# Altium integrated library Weidmueller_OMNIMATE_Signal.IntLib: 2550 symbols (part 11 of 45)
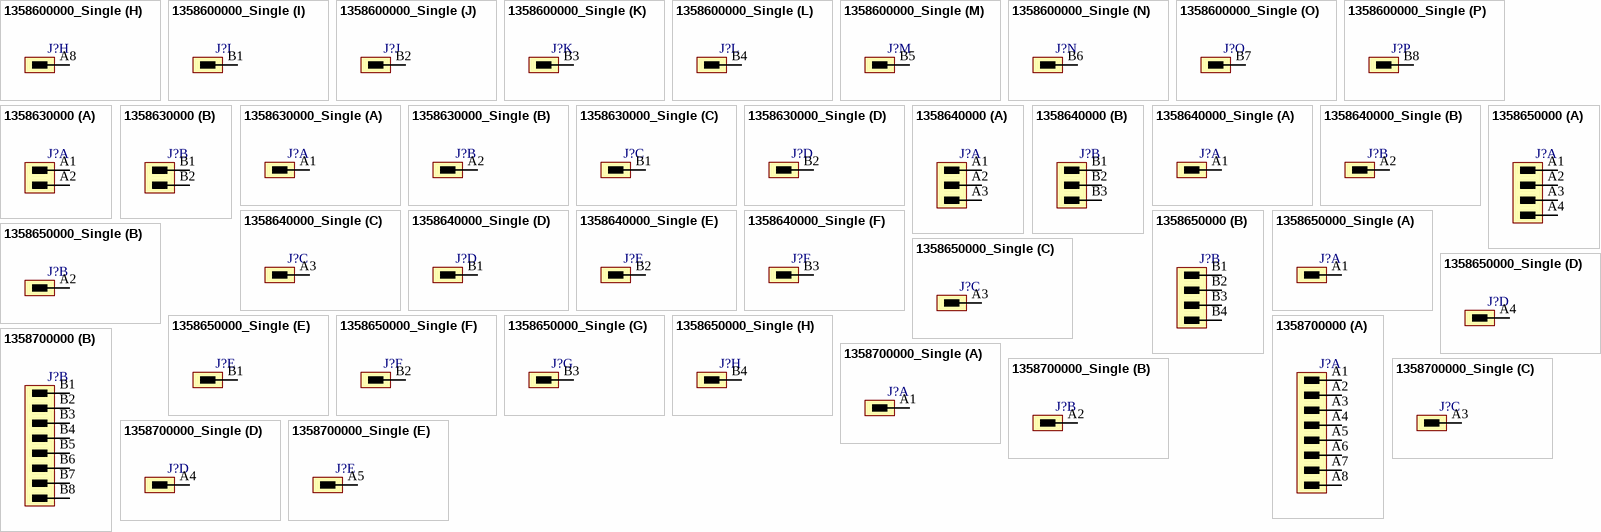
[diagram p221: symbols 1358600000_Single to 1358700000_Single]

## 1358630000_Single
designator J?
OMNIMATE Signal - series B2C/S2C 3.50 - 2-row; PartNumber: 1358630000; Manufacturer: Weidmueller; Short_text_for_material: S2C-SMT 3.50/04/180LF 1.5SN BK RL; Side_termination_characteristic: Solder flange; Mounting_onto_the_PCB: Reflow solder connection; Pitch_mm: 3.5 mm; Pitch_inch: 0.138 inch; No_of_poles: 4; Outgoing_elbow: 180°; Solder_pin_length_mm: 1.5 mm; Insulating_material: LCP GF; UL_94_flammability_rating: V-0; Rated_voltage_for_surge_voltage_class_pollution_degree_II_2: 200 V; Rated_current_min_no_of_poles_TU_20_deg_C: 13.4 A; Rated_voltage_use_group_B_UL_1059: 150 V; Rated_current_use_group_B_UL_1059: 10 A; PackageReference: S2C_SMT_3_50_180LF_04; Colour: Black; Packaging: Tape; Qty: 175 PCS; Revision: V1; ComponentLink1Description: Manufacturer URL; ComponentLink1URL: http://www.weidmueller.com/; ComponentLink2Description: URL Link1; ComponentLink2URL: http://catalog.weidmueller.com/catalog/Start.do?localeId=en&ObjectID=1358630000
footprint S2C_SMT_3_50_180LF_04 (OMNIMATE Signal - Serie B2C/S2C 3.50 - 2-reihig  S2C-SMT 3.50/04/180LF 3.5)
part A pins: A1
part B pins: A2
part C pins: B1
part D pins: B2

## 1358640000
designator J?
OMNIMATE Signal - series B2C/S2C 3.50 - 2-row; PartNumber: 1358640000; Manufacturer: Weidmueller; Short_text_for_material: S2C-SMT 3.50/06/180LF 1.5SN BK RL; Side_termination_characteristic: Solder flange; Mounting_onto_the_PCB: Reflow solder connection; Pitch_mm: 3.5 mm; Pitch_inch: 0.138 inch; No_of_poles: 6; Outgoing_elbow: 180°; Solder_pin_length_mm: 1.5 mm; Insulating_material: LCP GF; UL_94_flammability_rating: V-0; Rated_voltage_for_surge_voltage_class_pollution_degree_II_2: 200 V; Rated_current_min_no_of_poles_TU_20_deg_C: 13.4 A; Rated_voltage_use_group_B_UL_1059: 150 V; Rated_current_use_group_B_UL_1059: 10 A; PackageReference: S2C_SMT_3_50_180LF_06; Colour: Black; Packaging: Tape; Qty: 175 PCS; Revision: V1; ComponentLink1Description: Manufacturer URL; ComponentLink1URL: http://www.weidmueller.com/; ComponentLink2Description: URL Link1; ComponentLink2URL: http://catalog.weidmueller.com/catalog/Start.do?localeId=en&ObjectID=1358640000
footprint S2C_SMT_3_50_180LF_06 (OMNIMATE Signal - Serie B2C/S2C 3.50 - 2-reihig  S2C-SMT 3.50/06/180LF 3.5)
part A pins: A1, A2, A3
part B pins: B1, B2, B3

## 1358640000_Single
designator J?
OMNIMATE Signal - series B2C/S2C 3.50 - 2-row; PartNumber: 1358640000; Manufacturer: Weidmueller; Short_text_for_material: S2C-SMT 3.50/06/180LF 1.5SN BK RL; Side_termination_characteristic: Solder flange; Mounting_onto_the_PCB: Reflow solder connection; Pitch_mm: 3.5 mm; Pitch_inch: 0.138 inch; No_of_poles: 6; Outgoing_elbow: 180°; Solder_pin_length_mm: 1.5 mm; Insulating_material: LCP GF; UL_94_flammability_rating: V-0; Rated_voltage_for_surge_voltage_class_pollution_degree_II_2: 200 V; Rated_current_min_no_of_poles_TU_20_deg_C: 13.4 A; Rated_voltage_use_group_B_UL_1059: 150 V; Rated_current_use_group_B_UL_1059: 10 A; PackageReference: S2C_SMT_3_50_180LF_06; Colour: Black; Packaging: Tape; Qty: 175 PCS; Revision: V1; ComponentLink1Description: Manufacturer URL; ComponentLink1URL: http://www.weidmueller.com/; ComponentLink2Description: URL Link1; ComponentLink2URL: http://catalog.weidmueller.com/catalog/Start.do?localeId=en&ObjectID=1358640000
footprint S2C_SMT_3_50_180LF_06 (OMNIMATE Signal - Serie B2C/S2C 3.50 - 2-reihig  S2C-SMT 3.50/06/180LF 3.5)
part A pins: A1
part B pins: A2
part C pins: A3
part D pins: B1
part E pins: B2
part F pins: B3

## 1358650000
designator J?
OMNIMATE Signal - series B2C/S2C 3.50 - 2-row; PartNumber: 1358650000; Manufacturer: Weidmueller; Short_text_for_material: S2C-SMT 3.50/08/180LF 1.5SN BK RL; Side_termination_characteristic: Solder flange; Mounting_onto_the_PCB: Reflow solder connection; Pitch_mm: 3.5 mm; Pitch_inch: 0.138 inch; No_of_poles: 8; Outgoing_elbow: 180°; Solder_pin_length_mm: 1.5 mm; Insulating_material: LCP GF; UL_94_flammability_rating: V-0; Rated_voltage_for_surge_voltage_class_pollution_degree_II_2: 200 V; Rated_current_min_no_of_poles_TU_20_deg_C: 13.4 A; Rated_voltage_use_group_B_UL_1059: 150 V; Rated_current_use_group_B_UL_1059: 10 A; PackageReference: S2C_SMT_3_50_180LF_08; Colour: Black; Packaging: Tape; Qty: 175 PCS; Revision: V1; ComponentLink1Description: Manufacturer URL; ComponentLink1URL: http://www.weidmueller.com/; ComponentLink2Description: URL Link1; ComponentLink2URL: http://catalog.weidmueller.com/catalog/Start.do?localeId=en&ObjectID=1358650000
footprint S2C_SMT_3_50_180LF_08 (OMNIMATE Signal - Serie B2C/S2C 3.50 - 2-reihig  S2C-SMT 3.50/08/180LF 3.5)
part A pins: A1, A2, A3, A4
part B pins: B1, B2, B3, B4

## 1358650000_Single
designator J?
OMNIMATE Signal - series B2C/S2C 3.50 - 2-row; PartNumber: 1358650000; Manufacturer: Weidmueller; Short_text_for_material: S2C-SMT 3.50/08/180LF 1.5SN BK RL; Side_termination_characteristic: Solder flange; Mounting_onto_the_PCB: Reflow solder connection; Pitch_mm: 3.5 mm; Pitch_inch: 0.138 inch; No_of_poles: 8; Outgoing_elbow: 180°; Solder_pin_length_mm: 1.5 mm; Insulating_material: LCP GF; UL_94_flammability_rating: V-0; Rated_voltage_for_surge_voltage_class_pollution_degree_II_2: 200 V; Rated_current_min_no_of_poles_TU_20_deg_C: 13.4 A; Rated_voltage_use_group_B_UL_1059: 150 V; Rated_current_use_group_B_UL_1059: 10 A; PackageReference: S2C_SMT_3_50_180LF_08; Colour: Black; Packaging: Tape; Qty: 175 PCS; Revision: V1; ComponentLink1Description: Manufacturer URL; ComponentLink1URL: http://www.weidmueller.com/; ComponentLink2Description: URL Link1; ComponentLink2URL: http://catalog.weidmueller.com/catalog/Start.do?localeId=en&ObjectID=1358650000
footprint S2C_SMT_3_50_180LF_08 (OMNIMATE Signal - Serie B2C/S2C 3.50 - 2-reihig  S2C-SMT 3.50/08/180LF 3.5)
part A pins: A1
part B pins: A2
part C pins: A3
part D pins: A4
part E pins: B1
part F pins: B2
part G pins: B3
part H pins: B4

## 1358700000
designator J?
OMNIMATE Signal - series B2C/S2C 3.50 - 2-row; PartNumber: 1358700000; Manufacturer: Weidmueller; Short_text_for_material: S2C-SMT 3.50/16/180LF 1.5SN BK RL; Side_termination_characteristic: Solder flange; Mounting_onto_the_PCB: Reflow solder connection; Pitch_mm: 3.5 mm; Pitch_inch: 0.138 inch; No_of_poles: 16; Outgoing_elbow: 180°; Solder_pin_length_mm: 1.5 mm; Insulating_material: LCP GF; UL_94_flammability_rating: V-0; Rated_voltage_for_surge_voltage_class_pollution_degree_II_2: 200 V; Rated_current_min_no_of_poles_TU_20_deg_C: 13.4 A; Rated_voltage_use_group_B_UL_1059: 150 V; Rated_current_use_group_B_UL_1059: 10 A; PackageReference: S2C_SMT_3_50_180LF_16; Colour: Black; Packaging: Tape; Qty: 175 PCS; Revision: V1; ComponentLink1Description: Manufacturer URL; ComponentLink1URL: http://www.weidmueller.com/; ComponentLink2Description: URL Link1; ComponentLink2URL: http://catalog.weidmueller.com/catalog/Start.do?localeId=en&ObjectID=1358700000
footprint S2C_SMT_3_50_180LF_16 (OMNIMATE Signal - Serie B2C/S2C 3.50 - 2-reihig  S2C-SMT 3.50/16/180LF 3.5)
part A pins: A1, A2, A3, A4, A5, A6, A7, A8
part B pins: B1, B2, B3, B4, B5, B6, B7, B8

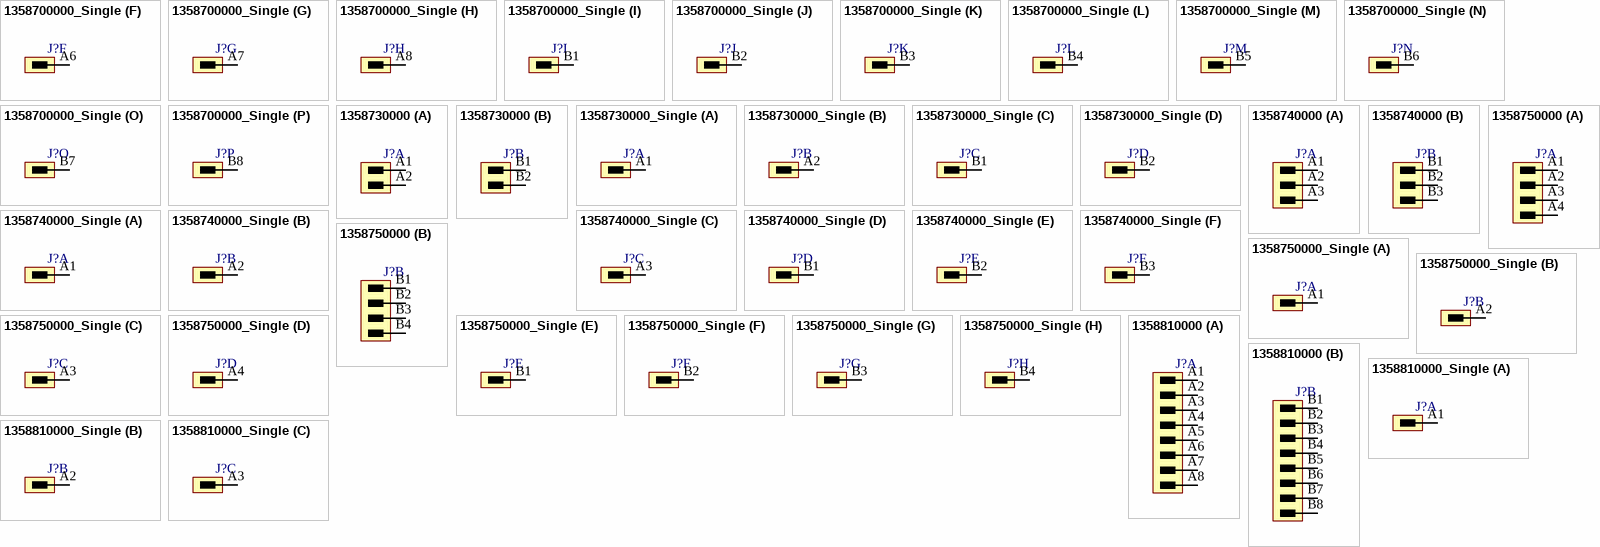
[diagram p60: symbols 1358700000_Single to 1358810000_Single]

## 1358700000_Single
designator J?
OMNIMATE Signal - series B2C/S2C 3.50 - 2-row; PartNumber: 1358700000; Manufacturer: Weidmueller; Short_text_for_material: S2C-SMT 3.50/16/180LF 1.5SN BK RL; Side_termination_characteristic: Solder flange; Mounting_onto_the_PCB: Reflow solder connection; Pitch_mm: 3.5 mm; Pitch_inch: 0.138 inch; No_of_poles: 16; Outgoing_elbow: 180°; Solder_pin_length_mm: 1.5 mm; Insulating_material: LCP GF; UL_94_flammability_rating: V-0; Rated_voltage_for_surge_voltage_class_pollution_degree_II_2: 200 V; Rated_current_min_no_of_poles_TU_20_deg_C: 13.4 A; Rated_voltage_use_group_B_UL_1059: 150 V; Rated_current_use_group_B_UL_1059: 10 A; PackageReference: S2C_SMT_3_50_180LF_16; Colour: Black; Packaging: Tape; Qty: 175 PCS; Revision: V1; ComponentLink1Description: Manufacturer URL; ComponentLink1URL: http://www.weidmueller.com/; ComponentLink2Description: URL Link1; ComponentLink2URL: http://catalog.weidmueller.com/catalog/Start.do?localeId=en&ObjectID=1358700000
footprint S2C_SMT_3_50_180LF_16 (OMNIMATE Signal - Serie B2C/S2C 3.50 - 2-reihig  S2C-SMT 3.50/16/180LF 3.5)
part A pins: A1
part B pins: A2
part C pins: A3
part D pins: A4
part E pins: A5
part F pins: A6
part G pins: A7
part H pins: A8
part I pins: B1
part J pins: B2
part K pins: B3
part L pins: B4
part M pins: B5
part N pins: B6
part O pins: B7
part P pins: B8

## 1358730000
designator J?
OMNIMATE Signal - series B2C/S2C 3.50 - 2-row; PartNumber: 1358730000; Manufacturer: Weidmueller; Short_text_for_material: S2C-SMT 3.50/04/180G 3.5SN BK RL; Side_termination_characteristic: closed side; Mounting_onto_the_PCB: Reflow solder connection; Pitch_mm: 3.5 mm; Pitch_inch: 0.138 inch; No_of_poles: 4; Outgoing_elbow: 180°; Insulating_material: LCP GF; UL_94_flammability_rating: V-0; Rated_voltage_for_surge_voltage_class_pollution_degree_II_2: 200 V; Rated_current_min_no_of_poles_TU_20_deg_C: 13.4 A; Rated_voltage_use_group_B_UL_1059: 150 V; Rated_current_use_group_B_UL_1059: 10 A; PackageReference: S2C_SMT_3_50_180G_04; Colour: Black; Solder_pin_length_mm: 3.5 mm; Packaging: Tape; Qty: 175 PCS; Revision: V1; ComponentLink1Description: Manufacturer URL; ComponentLink1URL: http://www.weidmueller.com/; ComponentLink2Description: URL Link1; ComponentLink2URL: http://catalog.weidmueller.com/catalog/Start.do?localeId=en&ObjectID=1358730000
footprint S2C_SMT_3_50_180G_04 (OMNIMATE Signal - Serie B2C/S2C 3.50 - 2-reihig  S2C-SMT 3.50/04/180G 1.5)
part A pins: A1, A2
part B pins: B1, B2

## 1358730000_Single
designator J?
OMNIMATE Signal - series B2C/S2C 3.50 - 2-row; PartNumber: 1358730000; Manufacturer: Weidmueller; Short_text_for_material: S2C-SMT 3.50/04/180G 3.5SN BK RL; Side_termination_characteristic: closed side; Mounting_onto_the_PCB: Reflow solder connection; Pitch_mm: 3.5 mm; Pitch_inch: 0.138 inch; No_of_poles: 4; Outgoing_elbow: 180°; Insulating_material: LCP GF; UL_94_flammability_rating: V-0; Rated_voltage_for_surge_voltage_class_pollution_degree_II_2: 200 V; Rated_current_min_no_of_poles_TU_20_deg_C: 13.4 A; Rated_voltage_use_group_B_UL_1059: 150 V; Rated_current_use_group_B_UL_1059: 10 A; PackageReference: S2C_SMT_3_50_180G_04; Colour: Black; Solder_pin_length_mm: 3.5 mm; Packaging: Tape; Qty: 175 PCS; Revision: V1; ComponentLink1Description: Manufacturer URL; ComponentLink1URL: http://www.weidmueller.com/; ComponentLink2Description: URL Link1; ComponentLink2URL: http://catalog.weidmueller.com/catalog/Start.do?localeId=en&ObjectID=1358730000
footprint S2C_SMT_3_50_180G_04 (OMNIMATE Signal - Serie B2C/S2C 3.50 - 2-reihig  S2C-SMT 3.50/04/180G 1.5)
part A pins: A1
part B pins: A2
part C pins: B1
part D pins: B2

## 1358740000
designator J?
OMNIMATE Signal - series B2C/S2C 3.50 - 2-row; PartNumber: 1358740000; Manufacturer: Weidmueller; Short_text_for_material: S2C-SMT 3.50/06/180G 3.5SN BK RL; Side_termination_characteristic: closed side; Mounting_onto_the_PCB: Reflow solder connection; Pitch_mm: 3.5 mm; Pitch_inch: 0.138 inch; No_of_poles: 6; Outgoing_elbow: 180°; Insulating_material: LCP GF; UL_94_flammability_rating: V-0; Rated_voltage_for_surge_voltage_class_pollution_degree_II_2: 200 V; Rated_current_min_no_of_poles_TU_20_deg_C: 13.4 A; Rated_voltage_use_group_B_UL_1059: 150 V; Rated_current_use_group_B_UL_1059: 10 A; PackageReference: S2C_SMT_3_50_180G_06; Colour: Black; Solder_pin_length_mm: 3.5 mm; Packaging: Tape; Qty: 175 PCS; Revision: V1; ComponentLink1Description: Manufacturer URL; ComponentLink1URL: http://www.weidmueller.com/; ComponentLink2Description: URL Link1; ComponentLink2URL: http://catalog.weidmueller.com/catalog/Start.do?localeId=en&ObjectID=1358740000
footprint S2C_SMT_3_50_180G_06 (OMNIMATE Signal - Serie B2C/S2C 3.50 - 2-reihig  S2C-SMT 3.50/06/180G 1.5)
part A pins: A1, A2, A3
part B pins: B1, B2, B3

## 1358740000_Single
designator J?
OMNIMATE Signal - series B2C/S2C 3.50 - 2-row; PartNumber: 1358740000; Manufacturer: Weidmueller; Short_text_for_material: S2C-SMT 3.50/06/180G 3.5SN BK RL; Side_termination_characteristic: closed side; Mounting_onto_the_PCB: Reflow solder connection; Pitch_mm: 3.5 mm; Pitch_inch: 0.138 inch; No_of_poles: 6; Outgoing_elbow: 180°; Insulating_material: LCP GF; UL_94_flammability_rating: V-0; Rated_voltage_for_surge_voltage_class_pollution_degree_II_2: 200 V; Rated_current_min_no_of_poles_TU_20_deg_C: 13.4 A; Rated_voltage_use_group_B_UL_1059: 150 V; Rated_current_use_group_B_UL_1059: 10 A; PackageReference: S2C_SMT_3_50_180G_06; Colour: Black; Solder_pin_length_mm: 3.5 mm; Packaging: Tape; Qty: 175 PCS; Revision: V1; ComponentLink1Description: Manufacturer URL; ComponentLink1URL: http://www.weidmueller.com/; ComponentLink2Description: URL Link1; ComponentLink2URL: http://catalog.weidmueller.com/catalog/Start.do?localeId=en&ObjectID=1358740000
footprint S2C_SMT_3_50_180G_06 (OMNIMATE Signal - Serie B2C/S2C 3.50 - 2-reihig  S2C-SMT 3.50/06/180G 1.5)
part A pins: A1
part B pins: A2
part C pins: A3
part D pins: B1
part E pins: B2
part F pins: B3

## 1358750000
designator J?
OMNIMATE Signal - series B2C/S2C 3.50 - 2-row; PartNumber: 1358750000; Manufacturer: Weidmueller; Short_text_for_material: S2C-SMT 3.50/08/180G 3.5SN BK RL; Side_termination_characteristic: closed side; Mounting_onto_the_PCB: Reflow solder connection; Pitch_mm: 3.5 mm; Pitch_inch: 0.138 inch; No_of_poles: 8; Outgoing_elbow: 180°; Insulating_material: LCP GF; UL_94_flammability_rating: V-0; Rated_voltage_for_surge_voltage_class_pollution_degree_II_2: 200 V; Rated_current_min_no_of_poles_TU_20_deg_C: 13.4 A; Rated_voltage_use_group_B_UL_1059: 150 V; Rated_current_use_group_B_UL_1059: 10 A; PackageReference: S2C_SMT_3_50_180G_08; Colour: Black; Solder_pin_length_mm: 3.5 mm; Packaging: Tape; Qty: 175 PCS; Revision: V1; ComponentLink1Description: Manufacturer URL; ComponentLink1URL: http://www.weidmueller.com/; ComponentLink2Description: URL Link1; ComponentLink2URL: http://catalog.weidmueller.com/catalog/Start.do?localeId=en&ObjectID=1358750000
footprint S2C_SMT_3_50_180G_08 (OMNIMATE Signal - Serie B2C/S2C 3.50 - 2-reihig  S2C-SMT 3.50/08/180G 1.5)
part A pins: A1, A2, A3, A4
part B pins: B1, B2, B3, B4

## 1358750000_Single
designator J?
OMNIMATE Signal - series B2C/S2C 3.50 - 2-row; PartNumber: 1358750000; Manufacturer: Weidmueller; Short_text_for_material: S2C-SMT 3.50/08/180G 3.5SN BK RL; Side_termination_characteristic: closed side; Mounting_onto_the_PCB: Reflow solder connection; Pitch_mm: 3.5 mm; Pitch_inch: 0.138 inch; No_of_poles: 8; Outgoing_elbow: 180°; Insulating_material: LCP GF; UL_94_flammability_rating: V-0; Rated_voltage_for_surge_voltage_class_pollution_degree_II_2: 200 V; Rated_current_min_no_of_poles_TU_20_deg_C: 13.4 A; Rated_voltage_use_group_B_UL_1059: 150 V; Rated_current_use_group_B_UL_1059: 10 A; PackageReference: S2C_SMT_3_50_180G_08; Colour: Black; Solder_pin_length_mm: 3.5 mm; Packaging: Tape; Qty: 175 PCS; Revision: V1; ComponentLink1Description: Manufacturer URL; ComponentLink1URL: http://www.weidmueller.com/; ComponentLink2Description: URL Link1; ComponentLink2URL: http://catalog.weidmueller.com/catalog/Start.do?localeId=en&ObjectID=1358750000
footprint S2C_SMT_3_50_180G_08 (OMNIMATE Signal - Serie B2C/S2C 3.50 - 2-reihig  S2C-SMT 3.50/08/180G 1.5)
part A pins: A1
part B pins: A2
part C pins: A3
part D pins: A4
part E pins: B1
part F pins: B2
part G pins: B3
part H pins: B4

## 1358810000
designator J?
OMNIMATE Signal - series B2C/S2C 3.50 - 2-row; PartNumber: 1358810000; Manufacturer: Weidmueller; Short_text_for_material: S2C-SMT 3.50/16/180G 3.5SN BK RL; Side_termination_characteristic: closed side; Mounting_onto_the_PCB: Reflow solder connection; Pitch_mm: 3.5 mm; Pitch_inch: 0.138 inch; No_of_poles: 16; Outgoing_elbow: 180°; Insulating_material: LCP GF; UL_94_flammability_rating: V-0; Rated_voltage_for_surge_voltage_class_pollution_degree_II_2: 200 V; Rated_current_min_no_of_poles_TU_20_deg_C: 13.4 A; Rated_voltage_use_group_B_UL_1059: 150 V; Rated_current_use_group_B_UL_1059: 10 A; PackageReference: S2C_SMT_3_50_180G_16; Colour: Black; Solder_pin_length_mm: 3.5 mm; Packaging: Tape; Qty: 175 PCS; Revision: V1; ComponentLink1Description: Manufacturer URL; ComponentLink1URL: http://www.weidmueller.com/; ComponentLink2Description: URL Link1; ComponentLink2URL: http://catalog.weidmueller.com/catalog/Start.do?localeId=en&ObjectID=1358810000
footprint S2C_SMT_3_50_180G_16 (OMNIMATE Signal - Serie B2C/S2C 3.50 - 2-reihig  S2C-SMT 3.50/16/180G 1.5)
part A pins: A1, A2, A3, A4, A5, A6, A7, A8
part B pins: B1, B2, B3, B4, B5, B6, B7, B8

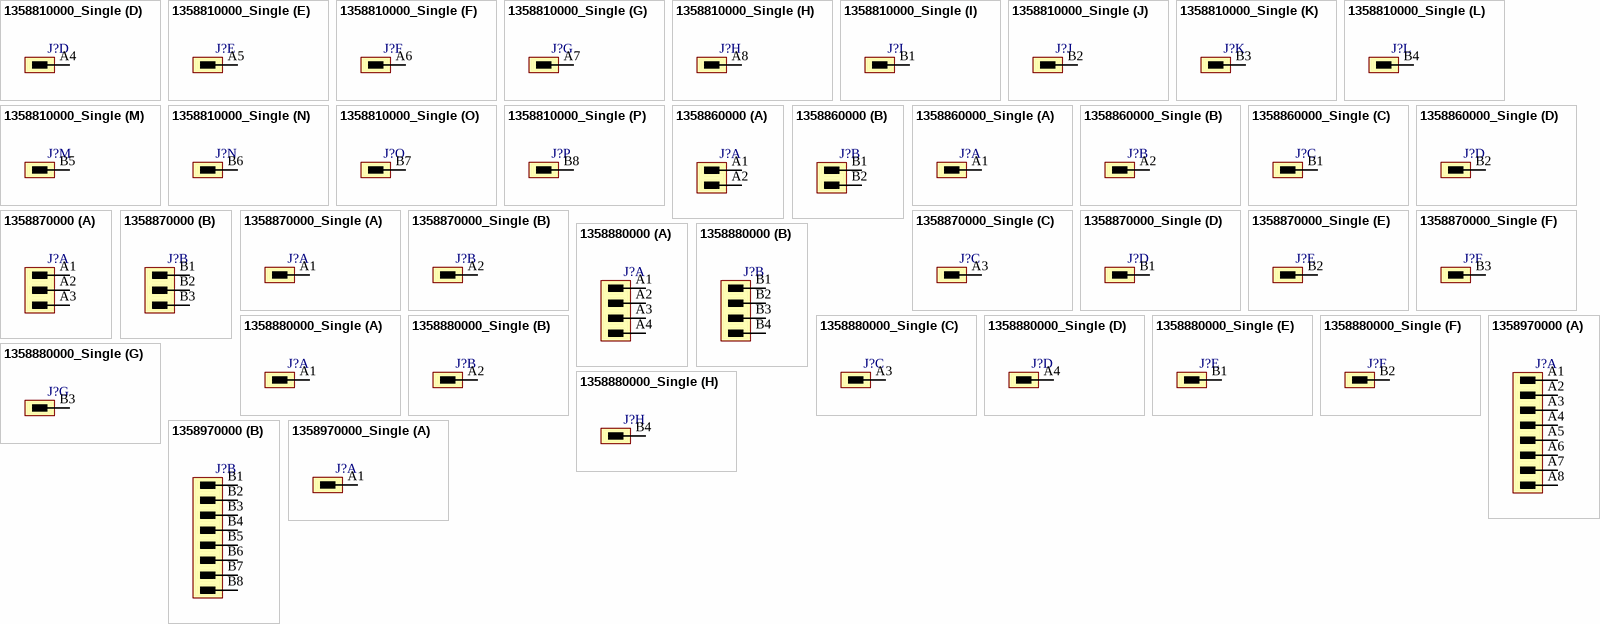
[diagram p61: symbols 1358810000_Single to 1358970000_Single]

## 1358810000_Single
designator J?
OMNIMATE Signal - series B2C/S2C 3.50 - 2-row; PartNumber: 1358810000; Manufacturer: Weidmueller; Short_text_for_material: S2C-SMT 3.50/16/180G 3.5SN BK RL; Side_termination_characteristic: closed side; Mounting_onto_the_PCB: Reflow solder connection; Pitch_mm: 3.5 mm; Pitch_inch: 0.138 inch; No_of_poles: 16; Outgoing_elbow: 180°; Insulating_material: LCP GF; UL_94_flammability_rating: V-0; Rated_voltage_for_surge_voltage_class_pollution_degree_II_2: 200 V; Rated_current_min_no_of_poles_TU_20_deg_C: 13.4 A; Rated_voltage_use_group_B_UL_1059: 150 V; Rated_current_use_group_B_UL_1059: 10 A; PackageReference: S2C_SMT_3_50_180G_16; Colour: Black; Solder_pin_length_mm: 3.5 mm; Packaging: Tape; Qty: 175 PCS; Revision: V1; ComponentLink1Description: Manufacturer URL; ComponentLink1URL: http://www.weidmueller.com/; ComponentLink2Description: URL Link1; ComponentLink2URL: http://catalog.weidmueller.com/catalog/Start.do?localeId=en&ObjectID=1358810000
footprint S2C_SMT_3_50_180G_16 (OMNIMATE Signal - Serie B2C/S2C 3.50 - 2-reihig  S2C-SMT 3.50/16/180G 1.5)
part A pins: A1
part B pins: A2
part C pins: A3
part D pins: A4
part E pins: A5
part F pins: A6
part G pins: A7
part H pins: A8
part I pins: B1
part J pins: B2
part K pins: B3
part L pins: B4
part M pins: B5
part N pins: B6
part O pins: B7
part P pins: B8

## 1358860000
designator J?
OMNIMATE Signal - series B2C/S2C 3.50 - 2-row; PartNumber: 1358860000; Manufacturer: Weidmueller; Short_text_for_material: S2C-SMT 3.50/04/180G 1.5SN BK RL; Side_termination_characteristic: closed side; Mounting_onto_the_PCB: Reflow solder connection; Pitch_mm: 3.5 mm; Pitch_inch: 0.138 inch; No_of_poles: 4; Outgoing_elbow: 180°; Solder_pin_length_mm: 1.5 mm; Insulating_material: LCP GF; UL_94_flammability_rating: V-0; Rated_voltage_for_surge_voltage_class_pollution_degree_II_2: 200 V; Rated_current_min_no_of_poles_TU_20_deg_C: 13.4 A; Rated_voltage_use_group_B_UL_1059: 150 V; Rated_current_use_group_B_UL_1059: 10 A; PackageReference: S2C_SMT_3_50_180G_04; Colour: Black; Packaging: Tape; Qty: 175 PCS; Revision: V1; ComponentLink1Description: Manufacturer URL; ComponentLink1URL: http://www.weidmueller.com/; ComponentLink2Description: URL Link1; ComponentLink2URL: http://catalog.weidmueller.com/catalog/Start.do?localeId=en&ObjectID=1358860000
footprint S2C_SMT_3_50_180G_04 (OMNIMATE Signal - Serie B2C/S2C 3.50 - 2-reihig  S2C-SMT 3.50/04/180G 1.5)
part A pins: A1, A2
part B pins: B1, B2

## 1358860000_Single
designator J?
OMNIMATE Signal - series B2C/S2C 3.50 - 2-row; PartNumber: 1358860000; Manufacturer: Weidmueller; Short_text_for_material: S2C-SMT 3.50/04/180G 1.5SN BK RL; Side_termination_characteristic: closed side; Mounting_onto_the_PCB: Reflow solder connection; Pitch_mm: 3.5 mm; Pitch_inch: 0.138 inch; No_of_poles: 4; Outgoing_elbow: 180°; Solder_pin_length_mm: 1.5 mm; Insulating_material: LCP GF; UL_94_flammability_rating: V-0; Rated_voltage_for_surge_voltage_class_pollution_degree_II_2: 200 V; Rated_current_min_no_of_poles_TU_20_deg_C: 13.4 A; Rated_voltage_use_group_B_UL_1059: 150 V; Rated_current_use_group_B_UL_1059: 10 A; PackageReference: S2C_SMT_3_50_180G_04; Colour: Black; Packaging: Tape; Qty: 175 PCS; Revision: V1; ComponentLink1Description: Manufacturer URL; ComponentLink1URL: http://www.weidmueller.com/; ComponentLink2Description: URL Link1; ComponentLink2URL: http://catalog.weidmueller.com/catalog/Start.do?localeId=en&ObjectID=1358860000
footprint S2C_SMT_3_50_180G_04 (OMNIMATE Signal - Serie B2C/S2C 3.50 - 2-reihig  S2C-SMT 3.50/04/180G 1.5)
part A pins: A1
part B pins: A2
part C pins: B1
part D pins: B2

## 1358870000
designator J?
OMNIMATE Signal - series B2C/S2C 3.50 - 2-row; PartNumber: 1358870000; Manufacturer: Weidmueller; Short_text_for_material: S2C-SMT 3.50/06/180G 1.5SN BK RL; Side_termination_characteristic: closed side; Mounting_onto_the_PCB: Reflow solder connection; Pitch_mm: 3.5 mm; Pitch_inch: 0.138 inch; No_of_poles: 6; Outgoing_elbow: 180°; Solder_pin_length_mm: 1.5 mm; Insulating_material: LCP GF; UL_94_flammability_rating: V-0; Rated_voltage_for_surge_voltage_class_pollution_degree_II_2: 200 V; Rated_current_min_no_of_poles_TU_20_deg_C: 13.4 A; Rated_voltage_use_group_B_UL_1059: 150 V; Rated_current_use_group_B_UL_1059: 10 A; PackageReference: S2C_SMT_3_50_180G_06; Colour: Black; Packaging: Tape; Qty: 175 PCS; Revision: V1; ComponentLink1Description: Manufacturer URL; ComponentLink1URL: http://www.weidmueller.com/; ComponentLink2Description: URL Link1; ComponentLink2URL: http://catalog.weidmueller.com/catalog/Start.do?localeId=en&ObjectID=1358870000
footprint S2C_SMT_3_50_180G_06 (OMNIMATE Signal - Serie B2C/S2C 3.50 - 2-reihig  S2C-SMT 3.50/06/180G 1.5)
part A pins: A1, A2, A3
part B pins: B1, B2, B3

## 1358870000_Single
designator J?
OMNIMATE Signal - series B2C/S2C 3.50 - 2-row; PartNumber: 1358870000; Manufacturer: Weidmueller; Short_text_for_material: S2C-SMT 3.50/06/180G 1.5SN BK RL; Side_termination_characteristic: closed side; Mounting_onto_the_PCB: Reflow solder connection; Pitch_mm: 3.5 mm; Pitch_inch: 0.138 inch; No_of_poles: 6; Outgoing_elbow: 180°; Solder_pin_length_mm: 1.5 mm; Insulating_material: LCP GF; UL_94_flammability_rating: V-0; Rated_voltage_for_surge_voltage_class_pollution_degree_II_2: 200 V; Rated_current_min_no_of_poles_TU_20_deg_C: 13.4 A; Rated_voltage_use_group_B_UL_1059: 150 V; Rated_current_use_group_B_UL_1059: 10 A; PackageReference: S2C_SMT_3_50_180G_06; Colour: Black; Packaging: Tape; Qty: 175 PCS; Revision: V1; ComponentLink1Description: Manufacturer URL; ComponentLink1URL: http://www.weidmueller.com/; ComponentLink2Description: URL Link1; ComponentLink2URL: http://catalog.weidmueller.com/catalog/Start.do?localeId=en&ObjectID=1358870000
footprint S2C_SMT_3_50_180G_06 (OMNIMATE Signal - Serie B2C/S2C 3.50 - 2-reihig  S2C-SMT 3.50/06/180G 1.5)
part A pins: A1
part B pins: A2
part C pins: A3
part D pins: B1
part E pins: B2
part F pins: B3

## 1358880000
designator J?
OMNIMATE Signal - series B2C/S2C 3.50 - 2-row; PartNumber: 1358880000; Manufacturer: Weidmueller; Short_text_for_material: S2C-SMT 3.50/08/180G 1.5SN BK RL; Side_termination_characteristic: closed side; Mounting_onto_the_PCB: Reflow solder connection; Pitch_mm: 3.5 mm; Pitch_inch: 0.138 inch; No_of_poles: 8; Outgoing_elbow: 180°; Solder_pin_length_mm: 1.5 mm; Insulating_material: LCP GF; UL_94_flammability_rating: V-0; Rated_voltage_for_surge_voltage_class_pollution_degree_II_2: 200 V; Rated_current_min_no_of_poles_TU_20_deg_C: 13.4 A; Rated_voltage_use_group_B_UL_1059: 150 V; Rated_current_use_group_B_UL_1059: 10 A; PackageReference: S2C_SMT_3_50_180G_08; Colour: Black; Packaging: Tape; Qty: 175 PCS; Revision: V1; ComponentLink1Description: Manufacturer URL; ComponentLink1URL: http://www.weidmueller.com/; ComponentLink2Description: URL Link1; ComponentLink2URL: http://catalog.weidmueller.com/catalog/Start.do?localeId=en&ObjectID=1358880000
footprint S2C_SMT_3_50_180G_08 (OMNIMATE Signal - Serie B2C/S2C 3.50 - 2-reihig  S2C-SMT 3.50/08/180G 1.5)
part A pins: A1, A2, A3, A4
part B pins: B1, B2, B3, B4

## 1358880000_Single
designator J?
OMNIMATE Signal - series B2C/S2C 3.50 - 2-row; PartNumber: 1358880000; Manufacturer: Weidmueller; Short_text_for_material: S2C-SMT 3.50/08/180G 1.5SN BK RL; Side_termination_characteristic: closed side; Mounting_onto_the_PCB: Reflow solder connection; Pitch_mm: 3.5 mm; Pitch_inch: 0.138 inch; No_of_poles: 8; Outgoing_elbow: 180°; Solder_pin_length_mm: 1.5 mm; Insulating_material: LCP GF; UL_94_flammability_rating: V-0; Rated_voltage_for_surge_voltage_class_pollution_degree_II_2: 200 V; Rated_current_min_no_of_poles_TU_20_deg_C: 13.4 A; Rated_voltage_use_group_B_UL_1059: 150 V; Rated_current_use_group_B_UL_1059: 10 A; PackageReference: S2C_SMT_3_50_180G_08; Colour: Black; Packaging: Tape; Qty: 175 PCS; Revision: V1; ComponentLink1Description: Manufacturer URL; ComponentLink1URL: http://www.weidmueller.com/; ComponentLink2Description: URL Link1; ComponentLink2URL: http://catalog.weidmueller.com/catalog/Start.do?localeId=en&ObjectID=1358880000
footprint S2C_SMT_3_50_180G_08 (OMNIMATE Signal - Serie B2C/S2C 3.50 - 2-reihig  S2C-SMT 3.50/08/180G 1.5)
part A pins: A1
part B pins: A2
part C pins: A3
part D pins: A4
part E pins: B1
part F pins: B2
part G pins: B3
part H pins: B4

## 1358970000
designator J?
OMNIMATE Signal - series B2C/S2C 3.50 - 2-row; PartNumber: 1358970000; Manufacturer: Weidmueller; Short_text_for_material: S2C-SMT 3.50/16/180G 1.5SN BK RL; Side_termination_characteristic: closed side; Mounting_onto_the_PCB: Reflow solder connection; Pitch_mm: 3.5 mm; Pitch_inch: 0.138 inch; No_of_poles: 16; Outgoing_elbow: 180°; Solder_pin_length_mm: 1.5 mm; Insulating_material: LCP GF; UL_94_flammability_rating: V-0; Rated_voltage_for_surge_voltage_class_pollution_degree_II_2: 200 V; Rated_current_min_no_of_poles_TU_20_deg_C: 13.4 A; Rated_voltage_use_group_B_UL_1059: 150 V; Rated_current_use_group_B_UL_1059: 10 A; PackageReference: S2C_SMT_3_50_180G_16; Colour: Black; Packaging: Tape; Qty: 175 PCS; Revision: V1; ComponentLink1Description: Manufacturer URL; ComponentLink1URL: http://www.weidmueller.com/; ComponentLink2Description: URL Link1; ComponentLink2URL: http://catalog.weidmueller.com/catalog/Start.do?localeId=en&ObjectID=1358970000
footprint S2C_SMT_3_50_180G_16 (OMNIMATE Signal - Serie B2C/S2C 3.50 - 2-reihig  S2C-SMT 3.50/16/180G 1.5)
part A pins: A1, A2, A3, A4, A5, A6, A7, A8
part B pins: B1, B2, B3, B4, B5, B6, B7, B8

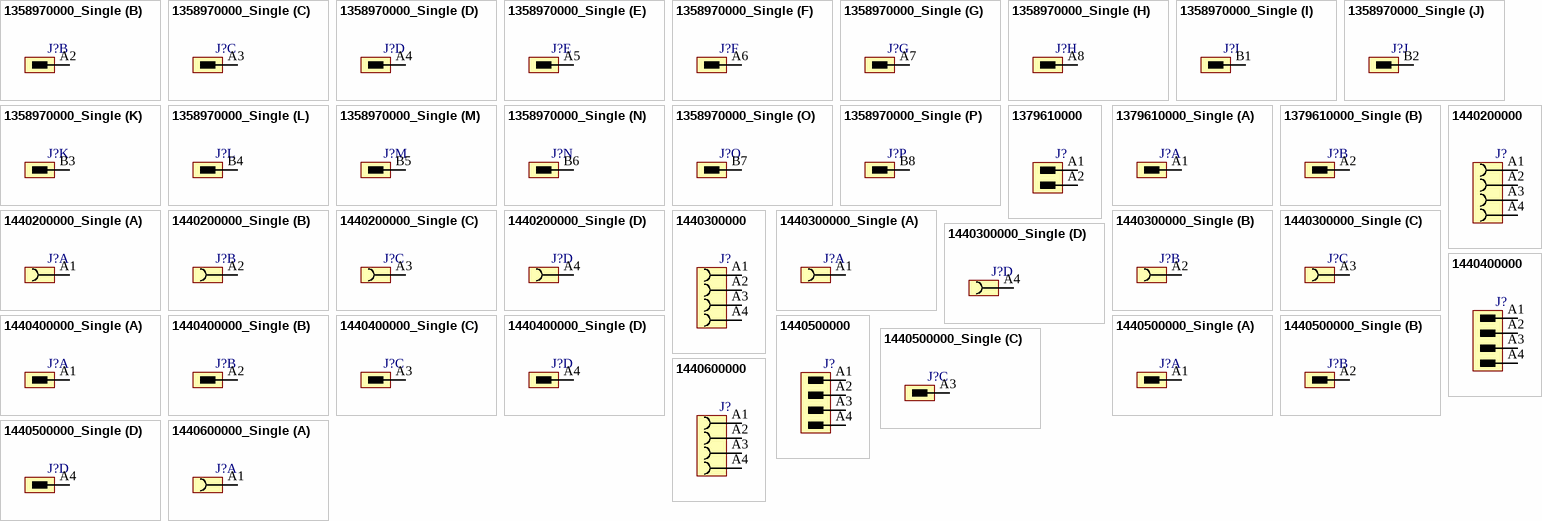
[diagram p62: symbols 1358970000_Single to 1440600000_Single]

## 1358970000_Single
designator J?
OMNIMATE Signal - series B2C/S2C 3.50 - 2-row; PartNumber: 1358970000; Manufacturer: Weidmueller; Short_text_for_material: S2C-SMT 3.50/16/180G 1.5SN BK RL; Side_termination_characteristic: closed side; Mounting_onto_the_PCB: Reflow solder connection; Pitch_mm: 3.5 mm; Pitch_inch: 0.138 inch; No_of_poles: 16; Outgoing_elbow: 180°; Solder_pin_length_mm: 1.5 mm; Insulating_material: LCP GF; UL_94_flammability_rating: V-0; Rated_voltage_for_surge_voltage_class_pollution_degree_II_2: 200 V; Rated_current_min_no_of_poles_TU_20_deg_C: 13.4 A; Rated_voltage_use_group_B_UL_1059: 150 V; Rated_current_use_group_B_UL_1059: 10 A; PackageReference: S2C_SMT_3_50_180G_16; Colour: Black; Packaging: Tape; Qty: 175 PCS; Revision: V1; ComponentLink1Description: Manufacturer URL; ComponentLink1URL: http://www.weidmueller.com/; ComponentLink2Description: URL Link1; ComponentLink2URL: http://catalog.weidmueller.com/catalog/Start.do?localeId=en&ObjectID=1358970000
footprint S2C_SMT_3_50_180G_16 (OMNIMATE Signal - Serie B2C/S2C 3.50 - 2-reihig  S2C-SMT 3.50/16/180G 1.5)
part A pins: A1
part B pins: A2
part C pins: A3
part D pins: A4
part E pins: A5
part F pins: A6
part G pins: A7
part H pins: A8
part I pins: B1
part J pins: B2
part K pins: B3
part L pins: B4
part M pins: B5
part N pins: B6
part O pins: B7
part P pins: B8

## 1379610000
designator J?
OMNIMATE Signal - series BL/SL 3.50; PartNumber: 1379610000; Manufacturer: Weidmueller; Short_text_for_material: SL-SMT 3.50/02/90RF 1.5SN BK BX; Side_termination_characteristic: Solder flange; Mounting_onto_the_PCB: Reflow solder connection; Pitch_mm: 3.5 mm; Pitch_inch: 0.138 inch; No_of_poles: 2; Outgoing_elbow: 90°; Solder_pin_length_mm: 1.5 mm; Contact_material: Cu-Leg; Contact_surface: tinned; Rated_current_min_no_of_poles_TU_20_deg_C: 32 A; Rated_voltage_use_group_B_UL_1059: 300 V; Rated_current_use_group_B_UL_1059: 10 A; PackageReference: SL_SMT_3_5_90RF_02; Colour: Black; Packaging: Box; Qty: 100 PCS; Revision: V1; ComponentLink1Description: Manufacturer URL; ComponentLink1URL: http://www.weidmueller.com/; ComponentLink2Description: URL Link1; ComponentLink2URL: http://catalog.weidmueller.com/catalog/Start.do?localeId=en&ObjectID=1379610000
footprint SL_SMT_3_5_90RF_02 (OMNIMATE Signal - Serie BL/SL 3.50  SL-SMT 3.50/02/90RF 1.5)
pins: A1, A2

## 1379610000_Single
designator J?
OMNIMATE Signal - series BL/SL 3.50; PartNumber: 1379610000; Manufacturer: Weidmueller; Short_text_for_material: SL-SMT 3.50/02/90RF 1.5SN BK BX; Side_termination_characteristic: Solder flange; Mounting_onto_the_PCB: Reflow solder connection; Pitch_mm: 3.5 mm; Pitch_inch: 0.138 inch; No_of_poles: 2; Outgoing_elbow: 90°; Solder_pin_length_mm: 1.5 mm; Contact_material: Cu-Leg; Contact_surface: tinned; Rated_current_min_no_of_poles_TU_20_deg_C: 32 A; Rated_voltage_use_group_B_UL_1059: 300 V; Rated_current_use_group_B_UL_1059: 10 A; PackageReference: SL_SMT_3_5_90RF_02; Colour: Black; Packaging: Box; Qty: 100 PCS; Revision: V1; ComponentLink1Description: Manufacturer URL; ComponentLink1URL: http://www.weidmueller.com/; ComponentLink2Description: URL Link1; ComponentLink2URL: http://catalog.weidmueller.com/catalog/Start.do?localeId=en&ObjectID=1379610000
footprint SL_SMT_3_5_90RF_02 (OMNIMATE Signal - Serie BL/SL 3.50  SL-SMT 3.50/02/90RF 1.5)
part A pins: A1
part B pins: A2

## 1440200000
designator J?
OMNIMATE Signal - series RSV; PartNumber: 1440200000; Manufacturer: Weidmueller; Short_text_for_material: RSV1,6 LB4 GR 3,2 AU; Pitch_mm: 5 mm; Pitch_inch: 0.197 inch; No_of_poles: 4; Solder_pin_length_mm: 3.2 mm; Contact_material: Cu-Leg; Contact_surface: Gold-plated; Insulating_material: Wemid (PA); UL_94_flammability_rating: V-0; Rated_voltage_for_surge_voltage_class_pollution_degree_II_2: 500 V; Rated_current_min_no_of_poles_TU_20_deg_C: 32 A; PackageReference: RSV1_6_LB_04; Colour: Pebble grey; Packaging: Box; Qty: 100 PCS; Revision: V1; ComponentLink1Description: Manufacturer URL; ComponentLink1URL: http://www.weidmueller.com/; ComponentLink2Description: URL Link1; ComponentLink2URL: http://catalog.weidmueller.com/catalog/Start.do?localeId=en&ObjectID=1440200000
footprint RSV1_6_LB_04 (OMNIMATE Signal - Serie RSV  RSV1,6 LB4 GR 3,2)
pins: A1, A2, A3, A4

## 1440200000_Single
designator J?
OMNIMATE Signal - series RSV; PartNumber: 1440200000; Manufacturer: Weidmueller; Short_text_for_material: RSV1,6 LB4 GR 3,2 AU; Pitch_mm: 5 mm; Pitch_inch: 0.197 inch; No_of_poles: 4; Solder_pin_length_mm: 3.2 mm; Contact_material: Cu-Leg; Contact_surface: Gold-plated; Insulating_material: Wemid (PA); UL_94_flammability_rating: V-0; Rated_voltage_for_surge_voltage_class_pollution_degree_II_2: 500 V; Rated_current_min_no_of_poles_TU_20_deg_C: 32 A; PackageReference: RSV1_6_LB_04; Colour: Pebble grey; Packaging: Box; Qty: 100 PCS; Revision: V1; ComponentLink1Description: Manufacturer URL; ComponentLink1URL: http://www.weidmueller.com/; ComponentLink2Description: URL Link1; ComponentLink2URL: http://catalog.weidmueller.com/catalog/Start.do?localeId=en&ObjectID=1440200000
footprint RSV1_6_LB_04 (OMNIMATE Signal - Serie RSV  RSV1,6 LB4 GR 3,2)
part A pins: A1
part B pins: A2
part C pins: A3
part D pins: A4

## 1440300000
designator J?
OMNIMATE Signal - series RSV; PartNumber: 1440300000; Manufacturer: Weidmueller; Short_text_for_material: RSV1,6 LB4 GR 3,2 SN; Pitch_mm: 5 mm; Pitch_inch: 0.197 inch; No_of_poles: 4; Solder_pin_length_mm: 3.2 mm; Contact_material: Cu-Leg; Contact_surface: tinned; Insulating_material: Wemid (PA); UL_94_flammability_rating: V-0; Rated_voltage_for_surge_voltage_class_pollution_degree_II_2: 500 V; Rated_current_min_no_of_poles_TU_20_deg_C: 32 A; PackageReference: RSV1_6_LB_04; Colour: Pebble grey; Packaging: Box; Qty: 100 PCS; Revision: V1; ComponentLink1Description: Manufacturer URL; ComponentLink1URL: http://www.weidmueller.com/; ComponentLink2Description: URL Link1; ComponentLink2URL: http://catalog.weidmueller.com/catalog/Start.do?localeId=en&ObjectID=1440300000
footprint RSV1_6_LB_04 (OMNIMATE Signal - Serie RSV  RSV1,6 LB4 GR 3,2)
pins: A1, A2, A3, A4

## 1440300000_Single
designator J?
OMNIMATE Signal - series RSV; PartNumber: 1440300000; Manufacturer: Weidmueller; Short_text_for_material: RSV1,6 LB4 GR 3,2 SN; Pitch_mm: 5 mm; Pitch_inch: 0.197 inch; No_of_poles: 4; Solder_pin_length_mm: 3.2 mm; Contact_material: Cu-Leg; Contact_surface: tinned; Insulating_material: Wemid (PA); UL_94_flammability_rating: V-0; Rated_voltage_for_surge_voltage_class_pollution_degree_II_2: 500 V; Rated_current_min_no_of_poles_TU_20_deg_C: 32 A; PackageReference: RSV1_6_LB_04; Colour: Pebble grey; Packaging: Box; Qty: 100 PCS; Revision: V1; ComponentLink1Description: Manufacturer URL; ComponentLink1URL: http://www.weidmueller.com/; ComponentLink2Description: URL Link1; ComponentLink2URL: http://catalog.weidmueller.com/catalog/Start.do?localeId=en&ObjectID=1440300000
footprint RSV1_6_LB_04 (OMNIMATE Signal - Serie RSV  RSV1,6 LB4 GR 3,2)
part A pins: A1
part B pins: A2
part C pins: A3
part D pins: A4

## 1440400000
designator J?
OMNIMATE Signal - series RSV; PartNumber: 1440400000; Manufacturer: Weidmueller; Short_text_for_material: RSV1,6 LS4 GR 3,2 AU; Side_termination_characteristic: closed side; Mounting_onto_the_PCB: Solder connection; Pitch_mm: 5 mm; Pitch_inch: 0.197 inch; No_of_poles: 4; Outgoing_elbow: 180°; Solder_pin_length_mm: 3.2 mm; Contact_material: Cu-Leg; Contact_surface: Gold-plated; Insulating_material: Wemid (PA); UL_94_flammability_rating: V-0; Rated_voltage_for_surge_voltage_class_pollution_degree_II_2: 500 V; Rated_current_min_no_of_poles_TU_20_deg_C: 32 A; PackageReference: RSV1_6_LS_04; Colour: Pebble grey; Packaging: Box; Qty: 100 PCS; Revision: V1; ComponentLink1Description: Manufacturer URL; ComponentLink1URL: http://www.weidmueller.com/; ComponentLink2Description: URL Link1; ComponentLink2URL: http://catalog.weidmueller.com/catalog/Start.do?localeId=en&ObjectID=1440400000
footprint RSV1_6_LS_04 (OMNIMATE Signal - Serie RSV  RSV1,6 LS4 GR 3,2)
pins: A1, A2, A3, A4

## 1440400000_Single
designator J?